# Altium footprint library NDLib.PCBLIB: 499 footprints (part 9 of 32)
Each footprint in its own frame and in the unit in brackets; x right, y up, seen from the top. Pads: shape width x height; smd on the part's side, far side on the other; paste and mask are expansions set on the pad; w line width, h text height; cw(c..) or ccw(c..) is an arc to the next point about the centre after c.
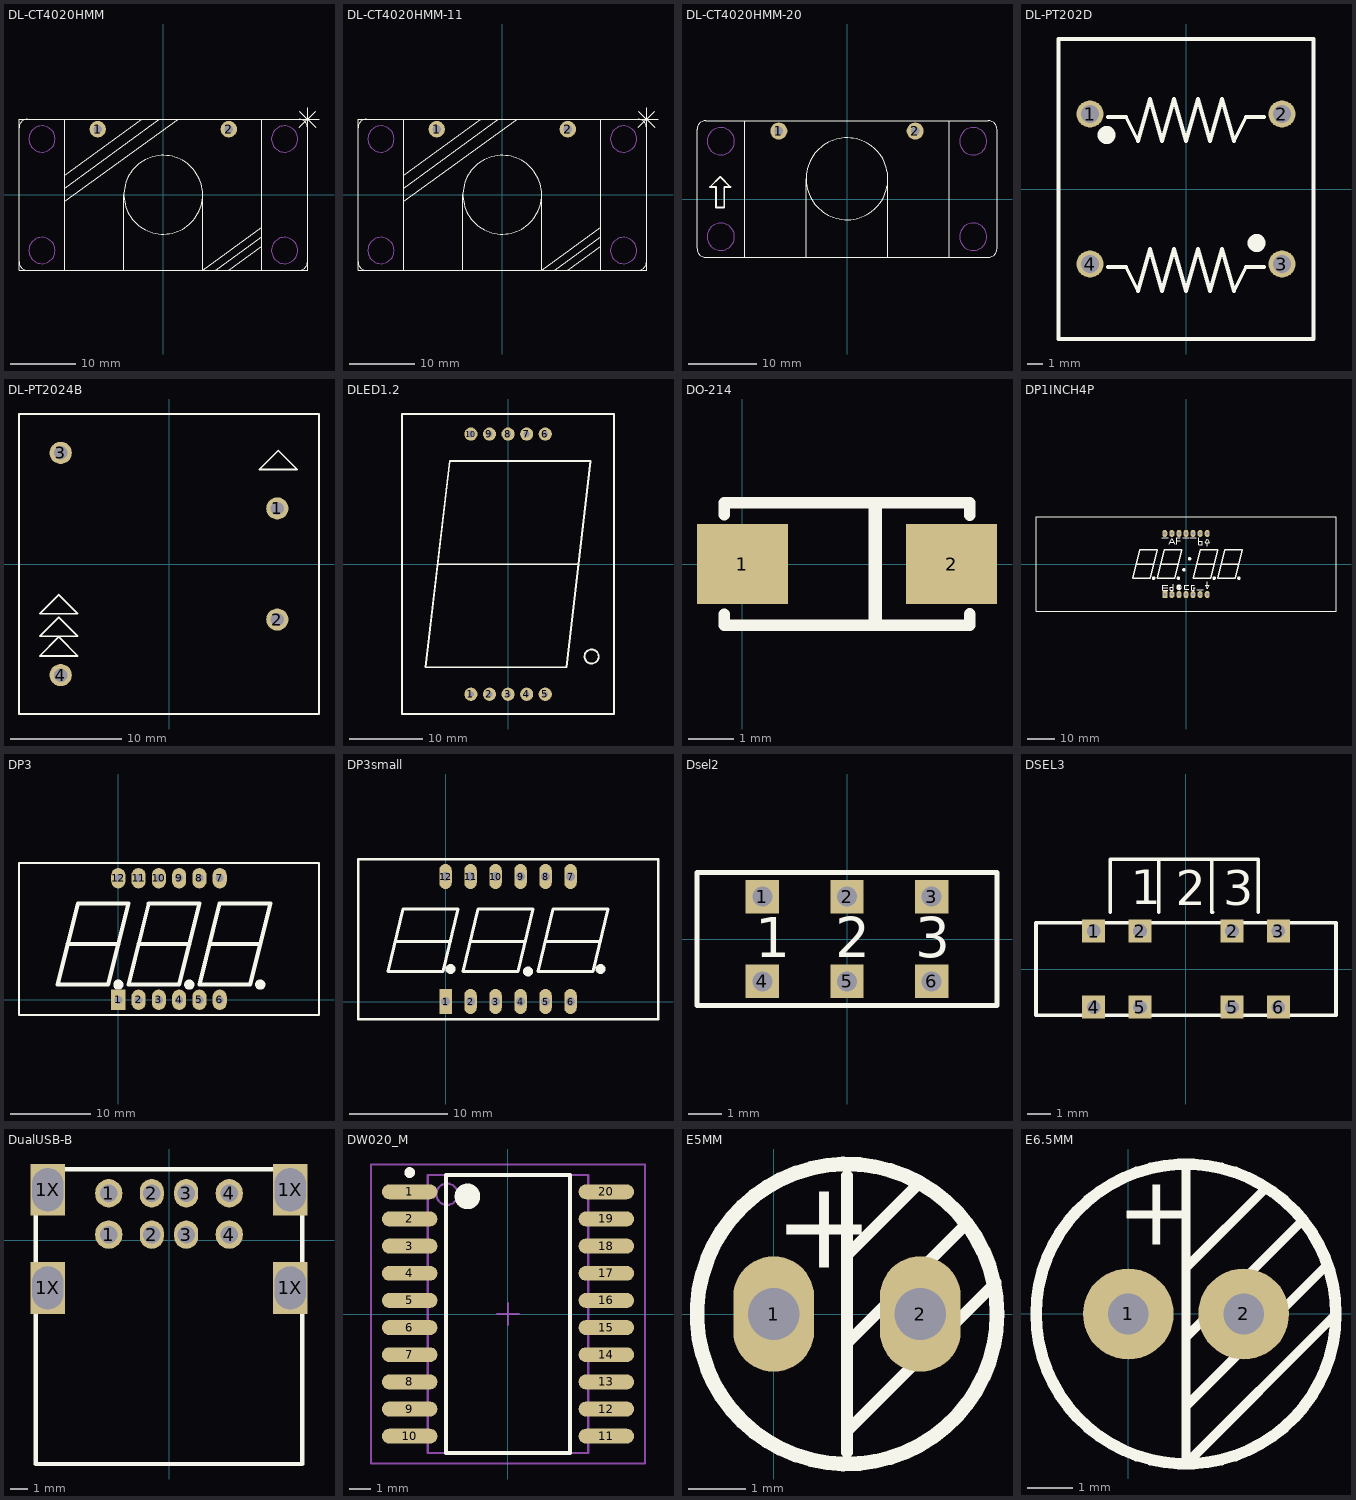
[diagram p8: the footprints below, top view; thin cyan lines are the x and y axes]

## DL-CT4020HMM [mm]
height 40
pads (2):
  round 2.5 hole 1.3: 1(-10,10) 2(10,10)
TopOverlay:
  circle w0.152: c0,0 r6
  lines w0.127: -22,-10.23 ccw(c-20.73,-10.23) -20.73,-11.5 ; -15,-11.5 -15,11.5 ; -15,-1 2.254,11.549 ; -15,1 -0.581,11.487 ; -15,3 -3.275,11.527 ; -6,-11.5 -6,0 ; 6,0 6,-11.5 15.016,-4.943 ; 8,-11.5 15.004,-6.406 ; 10,-11.5 15.007,-7.858 ; 15,-11.5 15,11.5 ; 20.25,11.5 23.75,11.5 ; 20.73,11.5 cw(c20.73,10.23) 22,10.23 ; 20.763,10.263 23.237,12.737 ; 20.763,12.737 23.237,10.263 ; 22,-10.23 cw(c20.73,-10.23) 20.73,-11.5 -22,-11.5 ; 22,9.75 22,13.25 ; -22,-11.5 -22,10.23 cw(c-20.73,10.23) -20.73,11.5 22,11.5 ; -22,-11.5 -22,11.5 22,11.5 ; -22,-11.5 22,-11.5 22,11.5
Mechanical1:
  circle w0.152: c-18.5,8.5 r2
  circle w0.152: c-18.5,-8.5 r2
  circle w0.152: c18.5,-8.5 r2
  circle w0.152: c18.5,8.5 r2

## DL-CT4020HMM-11 [mm]
height 40
pads (2):
  round 2.5 hole 1.3: 1(-10,10) 2(10,10)
TopOverlay:
  circle w0.152: c0,0 r6
  lines w0.127: -22,-10.23 ccw(c-20.73,-10.23) -20.73,-11.5 ; -15,-11.5 -15,11.5 ; -15,-1 2.254,11.549 ; -15,1 -0.581,11.487 ; -15,3 -3.275,11.527 ; -6,-11.5 -6,0 ; 6,0 6,-11.5 15.016,-4.943 ; 8,-11.5 15.004,-6.406 ; 10,-11.5 15.007,-7.858 ; 15,-11.5 15,11.5 ; 20.25,11.5 23.75,11.5 ; 20.73,11.5 cw(c20.73,10.23) 22,10.23 ; 20.763,10.263 23.237,12.737 ; 20.763,12.737 23.237,10.263 ; 22,-10.23 cw(c20.73,-10.23) 20.73,-11.5 -22,-11.5 ; 22,9.75 22,13.25 ; -22,-11.5 22,-11.5 22,11.5 ; -22,-11.5 -22,11.5 22,11.5 ; -22,-11.5 -22,10.23 cw(c-20.73,10.23) -20.73,11.5 22,11.5
Mechanical1:
  circle w0.152: c18.5,8.5 r2
  circle w0.152: c18.5,-8.5 r2
  circle w0.152: c-18.5,-8.5 r2
  circle w0.152: c-18.5,8.5 r2

## DL-CT4020HMM-20 [mm]
height 40
pads (2):
  round 2.5 hole 1.3: 1(-10,10) 2(10,10)
TopOverlay:
  circle w0.152: c0,3 r6
  lines w0.127: -22,-7.23 ccw(c-20.73,-7.23) -20.73,-8.5 ; -22,-7.197 -22,10.23 cw(c-20.73,10.23) -20.73,11.5 20.73,11.5 cw(c20.73,10.23) 22,10.23 22,-7.257 ; -20.756,-8.5 20.832,-8.5 ; -15,-8.454 -15,11.5 ; -6,-8.5 -6,3 ; 6,-8.5 6,3 ; 15,-8.454 15,11.5 ; 20.73,-8.5 ccw(c20.73,-7.23) 22,-7.23
  lines w0.254: -20.1,1.8 -18.6,3.3 -17.1,1.8 -18,1.8 -18,-1.2 -19.2,-1.2 -19.2,1.8 -20.1,1.8
Mechanical1:
  circle w0.152: c18.5,8.5 r2
  circle w0.152: c18.5,-5.5 r2
  circle w0.152: c-18.5,-5.5 r2
  circle w0.152: c-18.5,8.5 r2

## DL-PT202D [mm]
height 19
pads (4):
  round 1.8 hole 1.2: 1(-6.4,5) 2(6.4,5) 3(6.4,-5) 4(-6.4,-5)
TopOverlay:
  circle w1: c4.7,-3.6 r0.1
  circle w1: c-5.3,3.6 r0.1
  lines w0.254: -5.2,-5.2 -4,-5.2 -3.2,-6.8 -2.4,-4 -1.6,-6.8 -0.8,-4 0,-6.8 0.8,-4 1.6,-6.8 2.4,-4 3.2,-6.8 4,-5.2 5.2,-5.2 ; -5.2,4.8 -4,4.8 -3.2,3.2 -2.4,6 -1.6,3.2 -0.8,6 0,3.2 0.8,6 1.6,3.2 2.4,6 3.2,3.2 4,4.8 5.2,4.8 ; -8.5,-10 8.5,-10 8.5,10 -8.5,10 -8.5,-10

## DL-PT2024B [mm]
height 20.5
pads (4):
  round 2 hole 1.2: 1(9.75,5) 2(9.75,-5) 3(-9.75,10) 4(-9.75,-10)
TopOverlay:
  lines w0.152: -13.5,-13.5 13.5,-13.5 13.5,13.5 -13.5,13.5 -13.5,-13.5 ; -11.625,-8.275 -8.2,-8.275 -9.912,-6.563 -11.625,-8.275 ; -11.625,-6.497 -9.913,-4.785 -8.2,-6.497 -11.625,-6.497 ; -11.625,-4.465 -9.913,-2.753 -8.2,-4.465 -11.625,-4.465 ; 8.125,8.5 11.55,8.5 9.838,10.212 8.125,8.5

## DLED1.2 [mm]
height 5
pads (10):
  round 1.8 hole 0.813: 1(-5.08,-17.78) 2(-2.54,-17.78) 3(0,-17.78) 4(2.54,-17.78) 5(5.08,-17.78) 6(5.08,17.78) 7(2.54,17.78) 8(0,17.78) 9(-2.54,17.78)
  round 1.8 hole 1: 10(-5.08,17.78)
TopOverlay:
  lines w0.254: -14.48,20.5 -14.5,20.5 -14.5,-20.48 14.48,-20.48 14.46,-20.46 14.46,20.52 ; -14.48,20.52 14.46,20.52 ; -9.66,-0.02 9.64,-0.02 ; 12.386,-12.679 cw(c11.42,-12.62) 12.387,-12.62 ; 14.46,20.36 14.46,20.52 ; -11.28,-14.1 -7.98,14.1 11.28,14.1 7.98,-14.1 -11.28,-14.1

## DO-214 [mm]
height 2.7
pads (2):
  rect 2x1.75 smd: 1(0,0) 2(4.6,0)
TopOverlay:
  lines w0.254: -0.4,-1.105 -0.4,-1.35 5,-1.35 5,-1.1 ; -0.4,1.08 -0.4,1.35 4.995,1.35 ; 5,1.075 5,1.35
  lines w0.3: 2.92,-1.3 2.92,1.3
3D body: height 2.12, standoff -0.02, extent -0.198,-1.342 4.908,1.325

## DP1INCH4P [mil]
pads (14):
  rect 70x100 hole 40: 1(-300,-433.07)
  oval 70x100 hole 40: 2(-200,-433.07) 3(-100,-433.07) 4(0,-433.07) 5(100,-433.07) 6(200,-433.07) 7(300,-433.07) 8(300,433.07) 9(200,433.07) 10(100,433.07) 11(0,433.07) 12(-100,433.07) 13(-200,433.07) 14(-300,433.07)
TopOverlay:
  circle w30: c-28.74,-82.48 r10
  circle w30: c50,75 r10
  circle w30: c750,-200.59 r10
  circle w30: c-457.48,-200.59 r10
  circle w30: c-107.48,-200.59 r10
  circle w30: c400,-200.59 r10
  circle w10: c-100,-330 r14.14
  circle w10: c-100,-330 r31.62
  region: -250,363.86 -250,371.93 -350,371.93 -350,363.86
  region: 40,363.86 40,371.93 -50,371.93 -50,363.86
  region: 40,346.93 40,355 -50,355 -50,346.93
  region: 150,363.86 150,371.93 50,371.93 50,363.86
  region: 150,331.93 150,340 50,340 50,331.93
  region: 150,346.93 150,355 50,355 50,346.93
  region: 150,-346.93 150,-355 250,-355 250,-346.93
  region: 150,-331.93 150,-340 250,-340 250,-331.93
  region: 150,-316.93 150,-325 250,-325 250,-316.93
  region: 150,-363.86 150,-371.93 250,-371.93 250,-363.86
  lines w10: -330,-340 -260,-340 ; -260,-370 -270,-370 -330,-370 -330,-300 -260,-300 ; -240,280 -200,360 -160,280 ; -220,310 -181.25,310 ; -180,-330 -220,-330 -220,-370 -180,-370 -180,-290 ; -130,280 -130,370 -80,370 ; -130,330 -80,330 ; 40,-360 -20,-360 -20,-300 40,-300 ; 100,-340 120,-340 ; 120,-300 80,-300 80,-370 120,-370 120,-340 ; 130,-340 120,-340 ; 180,320 230,320 230,270 180,270 180,370 ; 300,-300 300,-250 ; 300,250 300,300 ; -2125.98,-669.29 2125.98,-669.29 2125.98,669.29 -2125.98,669.29 -2125.98,-669.29 ; 270,-300 330,-300 300,-350 270,-300 ; 270,300 300,350 330,300 270,300
  lines w20: -707.48,-0.59 -457.48,-0.59 ; -357.48,-0.59 -107.48,-0.59 ; 150,-0.59 400,-0.59 ; 500,-0.59 750,-0.59 ; -757.48,-200.59 -508.42,-200.59 -408.42,199.41 -657.48,199.41 -757.48,-200.59 ; -407.48,-200.59 -158.42,-200.59 -58.42,199.41 -307.48,199.41 -407.48,-200.59 ; 100,-200.59 349.07,-200.59 449.07,199.41 200,199.41 100,-200.59 ; 450,-200.59 550,199.41 799.07,199.41 699.07,-200.59 450,-200.59
BottomOverlay:
  circle w10: c-100,-330 r31.62
  circle w10: c-100,-330 r14.14
  region: 150,-363.86 150,-371.93 250,-371.93 250,-363.86
  region: 150,-316.93 150,-325 250,-325 250,-316.93
  region: 150,-331.93 150,-340 250,-340 250,-331.93
  region: 150,-346.93 150,-355 250,-355 250,-346.93
  region: 150,346.93 150,355 50,355 50,346.93
  region: 150,331.93 150,340 50,340 50,331.93
  region: 150,363.86 150,371.93 50,371.93 50,363.86
  region: 40,346.93 40,355 -50,355 -50,346.93
  region: 40,363.86 40,371.93 -50,371.93 -50,363.86
  region: -250,363.86 -250,371.93 -350,371.93 -350,363.86
  lines w10: -340,-370 -330,-370 -270,-370 -270,-300 -340,-300 ; -340,-340 -270,-340 ; -240,280 -200,360 -160,280 ; -220,-330 -180,-330 -180,-370 -220,-370 -220,-290 ; -220,310 -181.25,310 ; -120,330 -70,330 ; -120,370 -70,370 -70,280 ; -40,-360 20,-360 20,-300 -40,-300 ; 70,-340 80,-340 ; 80,-300 120,-300 120,-370 80,-370 80,-340 ; 100,-340 80,-340 ; 220,320 170,320 170,270 220,270 220,370 ; 300,-300 300,-250 ; 300,250 300,300 ; 270,-300 300,-350 330,-300 270,-300 ; 270,300 330,300 300,350 270,300

## DP3 [mil]
pads (12):
  rect 70x100 hole 40: 1(0,0)
  oval 70x100 hole 40: 2(100,0) 3(200,0) 4(300,0) 5(400,0) 6(500,0) 7(500,600) 8(400,600) 9(300,600) 10(200,600) 11(100,600) 12(0,600)
TopOverlay:
  circle w30: c700,75 r10
  circle w30: c350,75 r10
  circle w30: c0,75 r10
  lines w10: -490,-75 -490,675 990,675 990,-75 -490,-75
  lines w20: -250,275 0,275 ; 100,275 350,275 ; 450,275 700,275 ; -300,75 -200,475 50,475 -50,75 -300,75 ; 50,75 150,475 400,475 300,75 50,75 ; 400,75 500,475 750,475 650,75 400,75

## DP3small [mil]
pads (12):
  rect 50x100 hole 36: 1(0,0)
  oval 50x100 hole 36: 2(100,0) 3(200,0) 4(300,0) 5(400,0) 6(500,0) 7(500,500) 8(400,500) 9(300,500) 10(200,500) 11(100,500) 12(0,500)
TopOverlay:
  circle w20: c20,130 r10
  circle w20: c330,120 r10
  circle w20: c620,130 r10
  lines w10: -350,-70 -350,570 850,570 850,-70 -350,-70
  lines w12: -200,240 20,240 ; 100,240 320,240 ; 400,240 620,240 ; -230,120 -10,120 50,370 -170,370 -230,120 ; 70,120 290,120 350,370 130,370 70,120 ; 370,120 590,120 650,370 430,370 370,120

## Dsel2 [mm]
height 8
pads (6):
  rect 1x1 hole 0.6: 1(-2.54,1.27) 2(0,1.27) 3(2.54,1.27) 4(-2.54,-1.27) 5(0,-1.27) 6(2.54,-1.27)
TopOverlay:
  lines w0.152: -4.5,-2 -4.5,2 4.5,2 4.5,-2 -4.5,-2
  text "3" at 2.05,-0.55 h1.2
  text "2" at -0.35,-0.55 h1.2
  text "1" at -2.75,-0.55 h1.2

## DSEL3 [mm]
height 5
pads (8):
  rect 1x1 hole 0.6: 1(-4,1.65) 2(-2,1.65) 2(2,1.65) 3(4,1.65) 4(-4,-1.65) 5(-2,-1.65) 5(2,-1.65) 6(4,-1.65)
TopOverlay:
  lines w0.152: -3.286,2.463 -3.286,4.76 3.123,4.76 3.123,2.463 ; -1.175,2.463 -1.175,4.76 ; 1.106,4.76 1.106,2.463 1.152,2.463 ; -6.5,-2 6.5,-2 6.5,2 -6.5,2 -6.5,-2
  text "1" at -2.401,2.805 h1.5
  text "2" at -0.446,2.758 h1.5
  text "3" at 1.618,2.774 h1.5

## DualUSB-B [mm]
height 17.5
pads (12):
  oval 1.575x1.65 hole 1.016: 1(-3.5,0.325) 1(-3.5,2.725) 4(3.5,0.325) 4(3.5,2.725)
  rect 2x3 hole 1.8 slot 2.5 at 90 deg: 1X(-7.042,-2.775) 1X(-7.042,2.925) 1X(7.042,-2.775) 1X(7.042,2.925)
  oval 1.397x1.65 hole 1.016: 2(-1,0.325) 2(-1,2.725) 3(1,0.325) 3(1,2.725)
TopOverlay:
  lines w0.254: -7.75,-13 7.75,-13 7.75,4.125 -7.75,4.125 -7.75,-13

## DW020_M [mm] "SOIC, 20-Leads, Body 12.8x7.5mm, Pitch 1.27mm, IPC Low Density"
height 2.65
pads (20):
  oval 2.6x0.7 smd: 1(-4.6,5.715) 2(-4.6,4.445) 3(-4.6,3.175) 4(-4.6,1.905) 5(-4.6,0.635) 6(-4.6,-0.635) 7(-4.6,-1.905) 8(-4.6,-3.175) 9(-4.6,-4.445) 10(-4.6,-5.715) 11(4.6,-5.715) 12(4.6,-4.445) 13(4.6,-3.175) 14(4.6,-1.905) 15(4.6,-0.635) 16(4.6,0.635) 17(4.6,1.905) 18(4.6,3.175) 19(4.6,4.445) 20(4.6,5.715)
TopOverlay:
  circle w0.6: c-1.9,5.5 r0.3
  circle w0.25: c-4.6,6.615 r0.125
  lines w0.2: -2.9,-6.5 -2.9,6.5 2.9,6.5 2.9,-6.5 -2.9,-6.5
Mechanical13:
  circle w0.1: c-2.85,5.6 r0.5
  lines w0.1: -3.75,-6.5 -3.75,6.5 3.75,6.5 3.75,-6.5 -3.75,-6.5
Mechanical15:
  lines w0.1: -0.5,0 0.5,0 ; 0,-0.5 0,0.5 ; -6.4,-7 -6.4,7 6.4,7 6.4,-7 -6.4,-7
3D body: height 2.65, standoff 0, extent -5.105,-6.4 5.195,6.4

## E5MM [mm]
height 6
pads (2):
  oval 1.4x2 hole 0.9: 1(0,0) 2(2.54,0)
TopOverlay:
  circle w0.254: c1.27,0 r2.6
  lines w0.2: 1.27,-2.4 1.27,2.4 ; 1.27,-2.032 3.851,0.549 ; 1.27,-0.508 3.289,1.511 ; 1.27,1.016 2.527,2.273
  text "+" at 0,0.8 h1.52

## E6.5MM [mm]
pads (2):
  round 2 hole 0.9: 1(0,0) 2(2.54,0)
TopOverlay:
  circle w0.254: c1.27,0 r3.3
  lines w0.2: 1.27,-2.032 4.318,1.016 ; 1.27,-0.508 3.81,2.032 ; 1.27,1.016 3.048,2.794 ; 1.27,3.302 1.27,-3.302 4.52,-0.052
  text "+" at -0.254,1.524 h1.52